# Altium footprint library DrPCB.PcbLib: 910 footprints (part 2 of 57)
Each footprint in its own frame and in the unit in brackets; x right, y up, seen from the top. Pads: shape width x height; smd on the part's side, far side on the other; paste and mask are expansions set on the pad; w line width, h text height; cw(c..) or ccw(c..) is an arc to the next point about the centre after c.
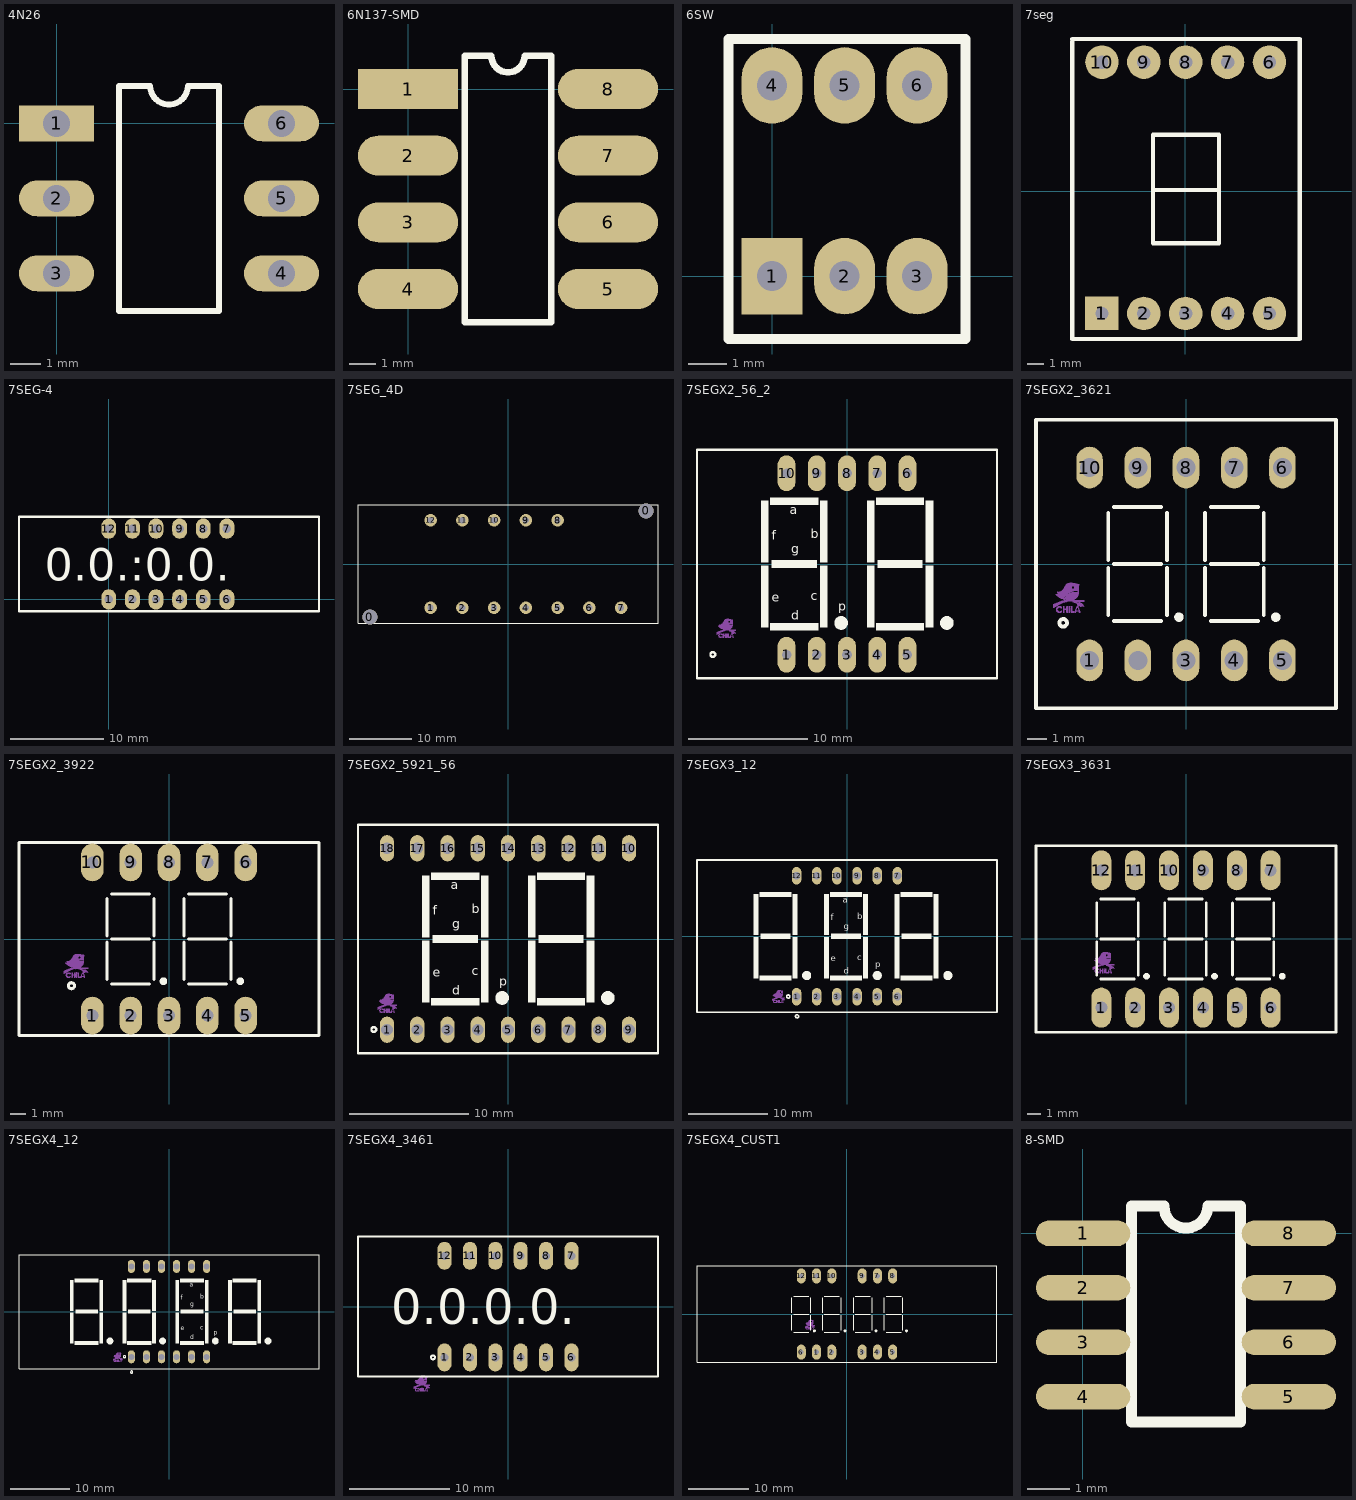
[diagram p1: the footprints below, top view; thin cyan lines are the x and y axes]

## 4N26 [mm]
pads (6):
  rect 2.5x1.2 hole 0.9: 1(0,0)
  oval 2.5x1.2 hole 0.9: 2(0,-2.5) 3(0,-5) 4(7.5,-5) 5(7.5,-2.5) 6(7.5,0)
Top Overlay:
  lines w0.2: 2.085,-6.25 2.085,1.25 3.125,1.25 ccw(c3.75,1.25) 4.375,1.25 5.415,1.25 5.415,-6.25 2.085,-6.25

## 6N137-SMD [mil]
pads (8):
  rect 150x60 smd: 1(0,0)
  oval 150x60 smd: 2(0,-100) 3(0,-200) 4(0,-300) 5(300,-300) 6(300,-200) 7(300,-100) 8(300,0)
Top Overlay:
  lines w10: 85,-350 85,50 125,50 ccw(c150,50) 175,50 215,50 215,-350 85,-350

## 6SW [mil]
pads (6):
  rect 63x79 hole 31: 1(-0.02,-0.09)
  oval 63x79 hole 31: 2(74.98,-0.09) 3(149.98,-0.09) 4(-0.02,196.91) 5(74.98,196.91) 6(149.98,196.91)
Top Overlay:
  lines w10: -45.02,-65.09 199.98,-65.09 199.98,244.91 -45.02,244.91 -45.02,-65.09

## 7seg [mm]
pads (10):
  rect 2x2 hole 0.8: 1(-4.976,-7.288)
  round 2 hole 0.8: 2(-2.476,-7.288) 3(0.024,-7.288) 4(2.524,-7.288) 5(5.024,-7.288) 6(5.024,7.712) 7(2.524,7.712) 8(0.024,7.712) 9(-2.476,7.712) 10(-4.976,7.712)
Top Overlay:
  lines w0.254: -6.754,9.095 6.835,9.095 6.835,-8.812 -6.754,-8.812 -6.754,8.968 -6.627,9.095 ; -1.928,0.078 2.009,0.078 ; -1.928,-3.097 2.009,-3.097 2.009,3.38 -1.928,3.38 -1.928,-3.097

## 7SEG-4 [mm]
pads (12):
  oval 1.6x2.2 hole 0.9: 1(0,0) 2(2.54,0) 3(5.08,0) 4(7.62,0) 5(10.16,0) 6(12.7,0) 7(12.7,7.62) 8(10.16,7.62) 9(7.62,7.62) 10(5.08,7.62) 11(2.54,7.62) 12(0,7.62)
Top Overlay:
  lines w0.254: 22.558,-1.27 -9.652,-1.27 -9.652,8.89 22.606,8.89 22.606,-1.27
  text "0.0.:0.0." at -6.858,2.032 h3.5

## 7SEG_4D [mm]
pads (14):
  round 2.4 hole 2.4: 0(-22.09,-8.5) 0(22.09,8.5)
  round 2 hole 1: 1(-12.39,-7) 2(-7.31,-7) 3(-2.23,-7) 4(2.85,-7) 5(7.93,-7) 6(13.01,-7) 7(18.09,-7) 8(7.93,7) 9(2.85,7) 10(-2.23,7) 11(-7.31,7) 12(-12.39,7)
Top Overlay:
  lines w0.2: -24,-9.5 -24,9.5 24,9.5 24,-9.5 -24,-9.5
3D body "Cc56-12.stp": height 8, standoff -2.5, extent -25,-9.5 25,9.5

## 7SEGX2_56_2 [mm] "7SEG 2DIGIT 16pin Pitch: 2.54mm    5621 0.56\", 19X25mm"
height 8
pads (10):
  oval 1.5x3 hole 0.8: 1(-5.08,-7.62) 2(-2.54,-7.62) 3(0,-7.62) 4(2.54,-7.62) 5(5.08,-7.62) 6(5.08,7.62) 7(2.54,7.62) 8(0,7.62) 9(-2.54,7.62) 10(-5.08,7.62)
Top Overlay:
  circle w0.2: c-11.27,-7.6 r0.2
  circle w0.635: c8.39,-4.953 r0.254
  circle w0.635: c-0.5,-4.953 r0.254
  rectangle: 1.659,-5.334 2.294,-0.127
  rectangle: 1.659,0.127 2.294,5.334
  rectangle: 6.612,0.127 7.247,5.334
  rectangle: 6.612,-5.334 7.247,-0.127
  rectangle: 2.421,4.953 6.485,5.588
  rectangle: 2.421,-5.588 6.485,-4.953
  rectangle: 2.548,-0.33 6.358,0.33
  rectangle: -6.342,-0.33 -2.532,0.33
  rectangle: -6.469,-5.588 -2.405,-4.953
  rectangle: -6.469,4.953 -2.405,5.588
  rectangle: -2.278,-5.334 -1.643,-0.127
  rectangle: -2.278,0.127 -1.643,5.334
  rectangle: -7.231,0.127 -6.596,5.334
  rectangle: -7.231,-5.334 -6.596,-0.127
  lines w0.2: -12.6,-9.6 12.6,-9.6 12.6,9.6 -12.6,9.6 -12.6,-9.6
  text "g" at -4.691,0.889 h0.76
  text "p" at -0.754,-3.937 h0.76
  text "b" at -3.04,2.159 h0.76
  text "e" at -6.342,-3.175 h0.76
  text "c" at -3.04,-3.048 h0.76
  text "d" at -4.691,-4.699 h0.76
  text "f" at -6.342,2.032 h0.76
  text "a" at -4.818,4.191 h0.76
Mechanical 16:
  drawing of 8 lines, arcs and shapes, not listed
3D body "User Library-King Bright DX56_2DIG.step": height 8.2, standoff -3.8, extent -12.5,-9.525 12.5,9.525

## 7SEGX2_3621 [mm] "7SEG 2DIGIT 10pin Pitch: 2.54mm  0.3\", 15.5X15mm"
height 8
pads (10):
  oval 1.4x2.2 hole 1: 1(-5.08,-5.08) 3(0,-5.08) 4(2.54,-5.08) 5(5.08,-5.08) 6(5.08,5.08) 7(2.54,5.08) 8(0,5.08) 9(-2.54,5.08) 10(-5.08,5.08) ""(-2.54,-5.08)
Top Overlay:
  circle w0.25: c4.73,-2.8 r0.125
  circle w0.25: c-0.37,-2.8 r0.125
  circle w0.2: c-6.47,-3.1 r0.2
  lines w0.2: -4.1,-2.7 -4.1,-0.2 ; -4.1,0.2 -4.1,2.7 ; -3.8,-3 -1.3,-3 ; -3.8,0 -1.3,0 ; -3.8,3 -1.3,3 ; -1,-2.7 -1,-0.2 ; -1,0.2 -1,2.7 ; 1,-2.7 1,-0.2 ; 1,0.2 1,2.7 ; 1.3,-3 3.8,-3 ; 1.3,0 3.8,0 ; 1.3,3 3.8,3 ; 4.1,-2.7 4.1,-0.2 ; 4.1,0.2 4.1,2.7 ; -7.9,-7.6 7.9,-7.6 7.9,7.6 -7.9,7.6 -7.9,-7.6
Mechanical 16:
  drawing of 8 lines, arcs and shapes, not listed
3D body "DX03-11.STEP": height 7.3, standoff -3.9, extent -7.75,-7.5 7.75,7.5

## 7SEGX2_3922 [mm] "7SEG 2DIGIT 10pin Pitch: 2.54mm  0.3\", 15.5X15mm"
height 8
pads (10):
  oval 1.5x2.5 hole 0.8: 1(-5.08,-5.08) 2(-2.54,-5.08) 3(0,-5.08) 4(2.54,-5.08) 5(5.08,-5.08) 6(5.08,5.08) 7(2.54,5.08) 8(0,5.08) 9(-2.54,5.08) 10(-5.08,5.08)
Top Overlay:
  circle w0.25: c4.73,-2.8 r0.125
  circle w0.25: c-0.37,-2.8 r0.125
  circle w0.2: c-6.47,-3.1 r0.2
  lines w0.2: -4.1,-2.7 -4.1,-0.2 ; -4.1,0.2 -4.1,2.7 ; -3.8,-3 -1.3,-3 ; -3.8,0 -1.3,0 ; -3.8,3 -1.3,3 ; -1,-2.7 -1,-0.2 ; -1,0.2 -1,2.7 ; 1,-2.7 1,-0.2 ; 1,0.2 1,2.7 ; 1.3,-3 3.8,-3 ; 1.3,0 3.8,0 ; 1.3,3 3.8,3 ; 4.1,-2.7 4.1,-0.2 ; 4.1,0.2 4.1,2.7 ; -9.95,-6.4 9.95,-6.4 9.95,6.4 -9.95,6.4 -9.95,-6.4
Mechanical 16:
  drawing of 8 lines, arcs and shapes, not listed

## 7SEGX2_5921_56 [mm] "7SEG 2DIGIT 16pin Pitch: 2.54mm    5621 0.56\", 19X25mm"
height 8
pads (18):
  oval 1.2x2.2 hole 1: 1(-10.16,-7.62) 2(-7.62,-7.62) 3(-5.08,-7.62) 4(-2.54,-7.62) 5(0,-7.62) 6(2.54,-7.62) 7(5.08,-7.62) 8(7.62,-7.62) 9(10.16,-7.62) 10(10.16,7.62) 11(7.62,7.62) 12(5.08,7.62) 13(2.54,7.62) 14(0,7.62) 15(-2.54,7.62) 16(-5.08,7.62) 17(-7.62,7.62) 18(-10.16,7.62)
Top Overlay:
  circle w0.635: c-0.5,-4.953 r0.254
  circle w0.635: c8.39,-4.953 r0.254
  circle w0.2: c-11.27,-7.6 r0.2
  rectangle: -7.231,-5.334 -6.596,-0.127
  rectangle: -7.231,0.127 -6.596,5.334
  rectangle: -2.278,0.127 -1.643,5.334
  rectangle: -2.278,-5.334 -1.643,-0.127
  rectangle: -6.469,4.953 -2.405,5.588
  rectangle: -6.469,-5.588 -2.405,-4.953
  rectangle: -6.342,-0.33 -2.532,0.33
  rectangle: 2.548,-0.33 6.358,0.33
  rectangle: 2.421,-5.588 6.485,-4.953
  rectangle: 2.421,4.953 6.485,5.588
  rectangle: 6.612,-5.334 7.247,-0.127
  rectangle: 6.612,0.127 7.247,5.334
  rectangle: 1.659,0.127 2.294,5.334
  rectangle: 1.659,-5.334 2.294,-0.127
  lines w0.2: -12.6,-9.6 -12.6,9.6 12.6,9.6 12.6,-9.6 -12.6,-9.6
  text "a" at -4.818,4.191 h0.76
  text "f" at -6.342,2.032 h0.76
  text "d" at -4.691,-4.699 h0.76
  text "c" at -3.04,-3.048 h0.76
  text "e" at -6.342,-3.175 h0.76
  text "b" at -3.04,2.159 h0.76
  text "p" at -0.754,-3.937 h0.76
  text "g" at -4.691,0.889 h0.76
Mechanical 16:
  drawing of 8 lines, arcs and shapes, not listed
3D body "User Library-King Bright DX56_2DIG.step": height 8.2, standoff -3.8, extent -12.5,-9.525 12.5,9.525

## 7SEGX3_12 [mm] "7SEG 3DIGIT 12pin Pitch: 2.54mm  5641 0.56\", 19X37.5mm"
height 7.62
pads (12):
  oval 1.2x2.2 hole 1: 1(-6.35,-7.62) 2(-3.81,-7.62) 3(-1.27,-7.62) 4(1.27,-7.62) 5(3.81,-7.62) 6(6.35,-7.62) 7(6.35,7.62) 8(3.81,7.62) 9(1.27,7.62) 10(-1.27,7.62) 11(-3.81,7.62) 12(-6.35,7.62)
Top Overlay:
  circle w0.2: c-6.3,-10.1 r0.2
  circle w0.2: c-7.4,-7.6 r0.2
  circle w0.635: c12.7,-4.953 r0.254
  circle w0.635: c-5.08,-4.953 r0.254
  circle w0.635: c3.81,-4.953 r0.254
  rectangle: 5.969,-5.334 6.604,-0.127
  rectangle: 5.969,0.127 6.604,5.334
  rectangle: 10.922,0.127 11.557,5.334
  rectangle: 10.922,-5.334 11.557,-0.127
  rectangle: 6.731,4.953 10.795,5.588
  rectangle: 6.731,-5.588 10.795,-4.953
  rectangle: 6.858,-0.33 10.668,0.33
  rectangle: -11.811,-5.334 -11.176,-0.127
  rectangle: -11.811,0.127 -11.176,5.334
  rectangle: -6.858,0.127 -6.223,5.334
  rectangle: -6.858,-5.334 -6.223,-0.127
  rectangle: -11.049,4.953 -6.985,5.588
  rectangle: -11.049,-5.588 -6.985,-4.953
  rectangle: -2.032,-0.33 1.778,0.33
  rectangle: -2.159,-5.588 1.905,-4.953
  rectangle: -2.159,4.953 1.905,5.588
  rectangle: 2.032,-5.334 2.667,-0.127
  rectangle: 2.032,0.127 2.667,5.334
  rectangle: -2.921,0.127 -2.286,5.334
  rectangle: -2.921,-5.334 -2.286,-0.127
  rectangle: -10.922,-0.33 -7.112,0.33
  lines w0.2: -18.9,-9.6 18.9,-9.6 18.9,9.6 -18.9,9.6 -18.9,-9.6
  text "g" at -0.381,0.889 h0.76
  text "p" at 3.556,-3.937 h0.76
  text "b" at 1.27,2.159 h0.76
  text "e" at -2.032,-3.175 h0.76
  text "c" at 1.27,-3.048 h0.76
  text "d" at -0.381,-4.699 h0.76
  text "f" at -2.032,2.032 h0.76
  text "a" at -0.508,4.191 h0.76
Mechanical 16:
  drawing of 8 lines, arcs and shapes, not listed
3D body "end-el-san Co Ltd-King Bright BX56-12A.step": height 8.2, standoff -3.9, extent -18.8,-9.5 18.8,9.5

## 7SEGX3_3631 [mm] "7SEG 2DIGIT 10pin Pitch: 2.54mm  0.3\", 15.5X15mm"
height 8
pads (12):
  oval 1.5x3 hole 0.9: 1(-6.35,-5.15) 2(-3.81,-5.15) 3(-1.27,-5.15) 4(1.27,-5.15) 5(3.81,-5.15) 6(6.35,-5.15) 7(6.35,5.15) 8(3.81,5.15) 9(1.27,5.15) 10(-1.27,5.15) 11(-3.81,5.15) 12(-6.35,5.15)
Top Overlay:
  circle w0.25: c2.139,-2.8 r0.125
  circle w0.25: c-2.961,-2.8 r0.125
  circle w0.25: c7.219,-2.8 r0.125
  lines w0.2: -11.25,-7 11.25,-7 ; -11.25,-6.962 -11.25,7 11.25,7 11.25,-6.962 11.201,-7.01 ; -6.691,-2.7 -6.691,-0.2 ; -6.691,0.2 -6.691,2.7 ; -6.391,-3 -3.891,-3 ; -6.391,0 -3.891,0 ; -6.391,3 -3.891,3 ; -3.591,-2.7 -3.591,-0.2 ; -3.591,0.2 -3.591,2.7 ; -1.591,-2.7 -1.591,-0.2 ; -1.591,0.2 -1.591,2.7 ; -1.291,-3 1.209,-3 ; -1.291,0 1.209,0 ; -1.291,3 1.209,3 ; 1.509,-2.7 1.509,-0.2 ; 1.509,0.2 1.509,2.7 ; 3.489,-2.7 3.489,-0.2 ; 3.489,0.2 3.489,2.7 ; 3.789,-3 6.289,-3 ; 3.789,0 6.289,0 ; 3.789,3 6.289,3 ; 6.589,-2.7 6.589,-0.2 ; 6.589,0.2 6.589,2.7
Mechanical 16:
  drawing of 8 lines, arcs and shapes, not listed
3D body "SD-3361_X.STEP": height 7.21, standoff -6.09, extent -11.25,-7 11.25,7

## 7SEGX4_12 [mm] "7SEG 4DIGIT 12pin Pitch: 2.54mm    5641 0.56\", 19X50.3mm"
height 7.62
pads (12):
  oval 1.2x2.2 hole 1: 1(-6.35,-7.62) 2(-3.81,-7.62) 3(-1.27,-7.62) 4(1.27,-7.62) 5(3.81,-7.62) 6(6.35,-7.62) 7(6.35,7.62) 8(3.81,7.62) 9(1.27,7.62) 10(-1.27,7.62) 11(-3.81,7.62) 12(-6.35,7.62)
Top Overlay:
  circle w0.635: c-9.97,-4.953 r0.254
  circle w0.635: c16.7,-4.953 r0.254
  circle w0.635: c-1.08,-4.953 r0.254
  circle w0.635: c7.81,-4.953 r0.254
  circle w0.2: c-7.5,-7.6 r0.2
  circle w0.2: c-6.3,-10.2 r0.2
  rectangle: -15.812,-0.33 -12.002,0.33
  rectangle: -15.939,-5.588 -11.875,-4.953
  rectangle: -15.939,4.953 -11.875,5.588
  rectangle: -11.748,-5.334 -11.113,-0.127
  rectangle: -11.748,0.127 -11.113,5.334
  rectangle: -16.701,0.127 -16.066,5.334
  rectangle: -16.701,-5.334 -16.066,-0.127
  rectangle: 9.969,-5.334 10.604,-0.127
  rectangle: 9.969,0.127 10.604,5.334
  rectangle: 14.922,0.127 15.557,5.334
  rectangle: 14.922,-5.334 15.557,-0.127
  rectangle: 10.731,4.953 14.795,5.588
  rectangle: 10.731,-5.588 14.795,-4.953
  rectangle: 10.858,-0.33 14.668,0.33
  rectangle: -7.811,-5.334 -7.176,-0.127
  rectangle: -7.811,0.127 -7.176,5.334
  rectangle: -2.858,0.127 -2.223,5.334
  rectangle: -2.858,-5.334 -2.223,-0.127
  rectangle: -7.049,4.953 -2.985,5.588
  rectangle: -7.049,-5.588 -2.985,-4.953
  rectangle: 1.968,-0.33 5.778,0.33
  rectangle: 1.841,-5.588 5.905,-4.953
  rectangle: 1.841,4.953 5.905,5.588
  rectangle: 6.032,-5.334 6.667,-0.127
  rectangle: 6.032,0.127 6.667,5.334
  rectangle: 1.079,0.127 1.714,5.334
  rectangle: 1.079,-5.334 1.714,-0.127
  rectangle: -6.922,-0.33 -3.112,0.33
  lines w0.2: -25.3,-9.6 25.3,-9.6 25.3,9.6 -25.3,9.6 -25.3,-9.6
  text "g" at 3.619,0.889 h0.76
  text "p" at 7.556,-3.937 h0.76
  text "b" at 5.27,2.159 h0.76
  text "e" at 1.968,-3.175 h0.76
  text "c" at 5.27,-3.048 h0.76
  text "d" at 3.619,-4.699 h0.76
  text "f" at 1.968,2.032 h0.76
  text "a" at 3.492,4.191 h0.76
Mechanical 16:
  drawing of 8 lines, arcs and shapes, not listed
3D body "User Library-C-564 (7 segment 4 digit LED display).step": height 8, standoff -6.2, extent -25.2,-9.5 25.2,9.5

## 7SEGX4_3461 [mm] "7SEG 4DIGIT 12pin Pitch: 2.54mm    5641 0.56\", 19X50.3mm"
height 7.62
pads (12):
  oval 1.4x2.8 hole 0.8: 1(-6.35,-5.08) 2(-3.81,-5.08) 3(-1.27,-5.08) 4(1.27,-5.08) 5(3.81,-5.08) 6(6.35,-5.08) 7(6.35,5.08) 8(3.81,5.08) 9(1.27,5.08) 10(-1.27,5.08) 11(-3.81,5.08) 12(-6.35,5.08)
Top Overlay:
  circle w0.2: c-7.5,-5.08 r0.2
  lines w0.2: -15,-7 15,-7 15,7 -15,7 -15,-7
  text "0.0.0.0." at -11.663,-1.749 h3.5
Mechanical 16:
  drawing of 8 lines, arcs and shapes, not listed

## 7SEGX4_CUST1 [mm] "7SEG 2DIGIT 10pin Pitch: 2.54mm  0.3\", 15.5X15mm"
height 8
pads (12):
  oval 1.5x2.5 hole 0.8: 1(-5.08,-6.35) 2(-2.54,-6.35) 3(2.54,-6.35) 4(5.08,-6.35) 5(7.62,-6.35) 6(-7.62,-6.35) 7(5.08,6.35) 8(7.62,6.35) 9(2.54,6.35) 10(-2.54,6.35) 11(-5.08,6.35) 12(-7.62,6.35)
Top Overlay:
  circle w0.25: c4.837,-2.8 r0.125
  circle w0.25: c9.937,-2.8 r0.125
  circle w0.25: c-0.35,-2.8 r0.125
  circle w0.25: c-5.45,-2.8 r0.125
  lines w0.2: -9.18,-2.7 -9.18,-0.2 ; -9.18,0.2 -9.18,2.7 ; -8.88,-3 -6.38,-3 ; -8.88,0 -6.38,0 ; -8.88,3 -6.38,3 ; -6.08,-2.7 -6.08,-0.2 ; -6.08,0.2 -6.08,2.7 ; -4.08,-2.7 -4.08,-0.2 ; -4.08,0.2 -4.08,2.7 ; -3.78,-3 -1.28,-3 ; -3.78,0 -1.28,0 ; -3.78,3 -1.28,3 ; -0.98,-2.7 -0.98,-0.2 ; -0.98,0.2 -0.98,2.7 ; 1.107,-2.7 1.107,-0.2 ; 1.107,0.2 1.107,2.7 ; 1.407,-3 3.907,-3 ; 1.407,0 3.907,0 ; 1.407,3 3.907,3 ; 4.207,-2.7 4.207,-0.2 ; 4.207,0.2 4.207,2.7 ; 6.207,-2.7 6.207,-0.2 ; 6.207,0.2 6.207,2.7 ; 6.507,-3 9.007,-3 ; 6.507,0 9.007,0 ; 6.507,3 9.007,3 ; 9.307,-2.7 9.307,-0.2 ; 9.307,0.2 9.307,2.7 ; -25,-8 -25,8 25,8 25,-8 -25,-8
Mechanical 16:
  drawing of 8 lines, arcs and shapes, not listed

## 8-SMD [mm]
pads (8):
  oval 2.2x0.6 smd: 1(0.013,0) 2(0.013,-1.27) 3(0.013,-2.54) 4(0.013,-3.81) 5(4.813,-3.81) 6(4.813,-2.54) 7(4.813,-1.27) 8(4.813,0)
Top Overlay:
  lines w0.254: 1.9,0.635 ccw(c2.411,0.635) 2.921,0.635 3.683,0.635 3.683,-4.405 1.143,-4.405 1.143,0.635 1.905,0.635